# Altium schematic symbol library jlcpcb_2025_04_inductors_extended_0603.schlib: 1269 symbols (part 1 of 7) (continued)
## CH1608H4N7S_f_
designator L?  Inductance: 4.7nH
Inductor, 4.7nH, 200mΩ, 500mA, SMD 0603; Manufacturer: CEC(Shenzhen Zhenhua Fu Elec); Manufacturer Part Number: CH1608H4N7S(f); Self-Resonant Frequency: 3GHz; Q Factor: 8@100MHz; Package Size: 0603; JLCPCB Basic Part: No; JLCPCB Part Number: C316309; Supplier 1: LCSC; Category: Inductors; Supplier Part Number 1: C316309; Rated Current: 500mA; DC Resistance: 200mΩ; RoHS: Yes; ComponentLink1Description: Datasheet; ComponentLink1URL: https://wmsc.lcsc.com/wmsc/upload/file/pdf/v2/lcsc/2304140030_CEC-Shenzhen-Zhenhua-Fu-Elec-CH1608H4N7S-f_C316309.pdf; ComponentLink2Description: JLCPCB Part URL; ComponentLink2URL: https://jlcpcb.com/partdetail/C316309; ComponentLink3Description: LCSC Part URL; ComponentLink3URL: https://lcsc.com/product-detail/Inductors-SMD_CECShenzhen-Zhenhua-Fu-Elec-CECShenzhen-Zhenhua-Fu-Elec-CH1608H4N7Sf_C316309.html
footprint IND-0603 (0603 (1608M) Inductor)
pins: 1, 2

## CH1608H5N6S_f_
designator L?  Inductance: 5.6nH
Inductor, 5.6nH, 300mΩ, 500mA, SMD 0603; Manufacturer: CEC(Shenzhen Zhenhua Fu Elec); Manufacturer Part Number: CH1608H5N6S(f); Self-Resonant Frequency: 3GHz; Q Factor: 8@100MHz; Package Size: 0603; JLCPCB Basic Part: No; JLCPCB Part Number: C316307; Supplier 1: LCSC; Category: Inductors; Supplier Part Number 1: C316307; Rated Current: 500mA; DC Resistance: 300mΩ; RoHS: Yes; ComponentLink1Description: Datasheet; ComponentLink1URL: https://wmsc.lcsc.com/wmsc/upload/file/pdf/v2/lcsc/2304140030_CEC-Shenzhen-Zhenhua-Fu-Elec-CH1608H5N6S-f_C316307.pdf; ComponentLink2Description: JLCPCB Part URL; ComponentLink2URL: https://jlcpcb.com/partdetail/C316307; ComponentLink3Description: LCSC Part URL; ComponentLink3URL: https://lcsc.com/product-detail/Inductors-SMD_CECShenzhen-Zhenhua-Fu-Elec-CECShenzhen-Zhenhua-Fu-Elec-CH1608H5N6Sf_C316307.html
footprint IND-0603 (0603 (1608M) Inductor)
pins: 1, 2

## CH1608H6N8J_f_
designator L?  Inductance: 6.8nH
Inductor, 6.8nH, ±5%, 300mΩ, 500mA, SMD 0603; Manufacturer: CEC(Shenzhen Zhenhua Fu Elec); Manufacturer Part Number: CH1608H6N8J(f); Self-Resonant Frequency: 3GHz; Q Factor: 8@100MHz; Package Size: 0603; JLCPCB Basic Part: No; JLCPCB Part Number: C316305; Supplier 1: LCSC; Category: Inductors; Supplier Part Number 1: C316305; Tolerance: ±5%; Rated Current: 500mA; DC Resistance: 300mΩ; RoHS: Yes; ComponentLink1Description: Datasheet; ComponentLink1URL: https://wmsc.lcsc.com/wmsc/upload/file/pdf/v2/lcsc/2304140030_CEC-Shenzhen-Zhenhua-Fu-Elec-CH1608H6N8J-f_C316305.pdf; ComponentLink2Description: JLCPCB Part URL; ComponentLink2URL: https://jlcpcb.com/partdetail/C316305; ComponentLink3Description: LCSC Part URL; ComponentLink3URL: https://lcsc.com/product-detail/Inductors-SMD_CECShenzhen-Zhenhua-Fu-Elec-CECShenzhen-Zhenhua-Fu-Elec-CH1608H6N8Jf_C316305.html
footprint IND-0603 (0603 (1608M) Inductor)
pins: 1, 2

## CH1608H12NJ_f_
designator L?  Inductance: 12nH
Inductor, 12nH, ±5%, 500mΩ, 300mA, SMD 0603; Manufacturer: CEC(Shenzhen Zhenhua Fu Elec); Manufacturer Part Number: CH1608H12NJ(f); Self-Resonant Frequency: 3GHz; Q Factor: 8@100MHz; Package Size: 0603; JLCPCB Basic Part: No; JLCPCB Part Number: C316323; Supplier 1: LCSC; Category: Inductors; Supplier Part Number 1: C316323; Tolerance: ±5%; Rated Current: 300mA; DC Resistance: 500mΩ; RoHS: Yes; ComponentLink1Description: Datasheet; ComponentLink1URL: https://wmsc.lcsc.com/wmsc/upload/file/pdf/v2/lcsc/2304140030_CEC-Shenzhen-Zhenhua-Fu-Elec-CH1608H12NJ-f_C316323.pdf; ComponentLink2Description: JLCPCB Part URL; ComponentLink2URL: https://jlcpcb.com/partdetail/C316323; ComponentLink3Description: LCSC Part URL; ComponentLink3URL: https://lcsc.com/product-detail/Inductors-SMD_CECShenzhen-Zhenhua-Fu-Elec-CECShenzhen-Zhenhua-Fu-Elec-CH1608H12NJf_C316323.html
footprint IND-0603 (0603 (1608M) Inductor)
pins: 1, 2

## CH1608H18NJ_f_
designator L?  Inductance: 18nH
Inductor, 18nH, ±5%, 600mΩ, 300mA, SMD 0603; Manufacturer: CEC(Shenzhen Zhenhua Fu Elec); Manufacturer Part Number: CH1608H18NJ(f); Self-Resonant Frequency: 3GHz; Q Factor: 8@100MHz; Package Size: 0603; JLCPCB Basic Part: No; JLCPCB Part Number: C316321; Supplier 1: LCSC; Category: Inductors; Supplier Part Number 1: C316321; Tolerance: ±5%; Rated Current: 300mA; DC Resistance: 600mΩ; RoHS: Yes; ComponentLink1Description: Datasheet; ComponentLink1URL: https://wmsc.lcsc.com/wmsc/upload/file/pdf/v2/lcsc/2304140030_CEC-Shenzhen-Zhenhua-Fu-Elec-CH1608H18NJ-f_C316321.pdf; ComponentLink2Description: JLCPCB Part URL; ComponentLink2URL: https://jlcpcb.com/partdetail/C316321; ComponentLink3Description: LCSC Part URL; ComponentLink3URL: https://lcsc.com/product-detail/Inductors-SMD_CECShenzhen-Zhenhua-Fu-Elec-CECShenzhen-Zhenhua-Fu-Elec-CH1608H18NJf_C316321.html
footprint IND-0603 (0603 (1608M) Inductor)
pins: 1, 2

## CH1608H27NJ_f_
designator L?  Inductance: 27nH
Inductor, 27nH, ±5%, 800mΩ, 300mA, SMD 0603; Manufacturer: CEC(Shenzhen Zhenhua Fu Elec); Manufacturer Part Number: CH1608H27NJ(f); Self-Resonant Frequency: 3GHz; Q Factor: 8@100MHz; Package Size: 0603; JLCPCB Basic Part: No; JLCPCB Part Number: C316316; Supplier 1: LCSC; Category: Inductors; Supplier Part Number 1: C316316; Tolerance: ±5%; Rated Current: 300mA; DC Resistance: 800mΩ; RoHS: Yes; ComponentLink1Description: Datasheet; ComponentLink1URL: https://wmsc.lcsc.com/wmsc/upload/file/pdf/v2/lcsc/2304140030_CEC-Shenzhen-Zhenhua-Fu-Elec-CH1608H27NJ-f_C316316.pdf; ComponentLink2Description: JLCPCB Part URL; ComponentLink2URL: https://jlcpcb.com/partdetail/C316316; ComponentLink3Description: LCSC Part URL; ComponentLink3URL: https://lcsc.com/product-detail/Inductors-SMD_CECShenzhen-Zhenhua-Fu-Elec-CECShenzhen-Zhenhua-Fu-Elec-CH1608H27NJf_C316316.html
footprint IND-0603 (0603 (1608M) Inductor)
pins: 1, 2

## CI1608AR12K
designator L?  Inductance: 120nH
Inductor, 120nH, ±10%, 500mΩ, 50mA, SMD 0603; Manufacturer: CEC(Shenzhen Zhenhua Fu Elec); Manufacturer Part Number: CI1608AR12K; Self-Resonant Frequency: 205MHz; Q Factor: 15@25MHz; Package Size: 0603; JLCPCB Basic Part: No; JLCPCB Part Number: C107493; Supplier 1: LCSC; Category: Inductors; Supplier Part Number 1: C107493; Tolerance: ±10%; Rated Current: 50mA; DC Resistance: 500mΩ; RoHS: Yes; ComponentLink1Description: Datasheet; ComponentLink1URL: https://wmsc.lcsc.com/wmsc/upload/file/pdf/v2/lcsc/2304140030_CEC-Shenzhen-Zhenhua-Fu-Elec-CI1608AR12K_C107493.pdf; ComponentLink2Description: JLCPCB Part URL; ComponentLink2URL: https://jlcpcb.com/partdetail/C107493; ComponentLink3Description: LCSC Part URL; ComponentLink3URL: https://lcsc.com/product-detail/Inductors-SMD_CECShenzhen-Zhenhua-Fu-Elec-CECShenzhen-Zhenhua-Fu-Elec-CI1608AR12K_C107493.html
footprint IND-0603 (0603 (1608M) Inductor)
pins: 1, 2

## CI1608AR15K
designator L?  Inductance: 150nH
Inductor, 150nH, ±10%, 600mΩ, 50mA, SMD 0603; Manufacturer: CEC(Shenzhen Zhenhua Fu Elec); Manufacturer Part Number: CI1608AR15K; Self-Resonant Frequency: 180MHz; Q Factor: 15@25MHz; Package Size: 0603; JLCPCB Basic Part: No; JLCPCB Part Number: C107494; Supplier 1: LCSC; Category: Inductors; Supplier Part Number 1: C107494; Tolerance: ±10%; Rated Current: 50mA; DC Resistance: 600mΩ; RoHS: Yes; ComponentLink1Description: Datasheet; ComponentLink1URL: https://wmsc.lcsc.com/wmsc/upload/file/pdf/v2/lcsc/2304140030_CEC-Shenzhen-Zhenhua-Fu-Elec-CI1608AR15K_C107494.pdf; ComponentLink2Description: JLCPCB Part URL; ComponentLink2URL: https://jlcpcb.com/partdetail/C107494; ComponentLink3Description: LCSC Part URL; ComponentLink3URL: https://lcsc.com/product-detail/Inductors-SMD_CECShenzhen-Zhenhua-Fu-Elec-CECShenzhen-Zhenhua-Fu-Elec-CI1608AR15K_C107494.html
footprint IND-0603 (0603 (1608M) Inductor)
pins: 1, 2

## CI1608B1R8K
designator L?  Inductance: 1.8uH
Inductor, 1.8uH, ±10%, 950mΩ, 25mA, SMD 0603; Manufacturer: CEC(Shenzhen Zhenhua Fu Elec); Manufacturer Part Number: CI1608B1R8K; Self-Resonant Frequency: 50MHz; Q Factor: 35@10MHz; Package Size: 0603; JLCPCB Basic Part: No; JLCPCB Part Number: C107507; Supplier 1: LCSC; Category: Inductors; Supplier Part Number 1: C107507; Tolerance: ±10%; Rated Current: 25mA; DC Resistance: 950mΩ; RoHS: Yes; ComponentLink1Description: Datasheet; ComponentLink1URL: https://wmsc.lcsc.com/wmsc/upload/file/pdf/v2/lcsc/2304140030_CEC-Shenzhen-Zhenhua-Fu-Elec-CI1608B1R8K_C107507.pdf; ComponentLink2Description: JLCPCB Part URL; ComponentLink2URL: https://jlcpcb.com/partdetail/C107507; ComponentLink3Description: LCSC Part URL; ComponentLink3URL: https://lcsc.com/product-detail/Inductors-SMD_CECShenzhen-Zhenhua-Fu-Elec-CECShenzhen-Zhenhua-Fu-Elec-CI1608B1R8K_C107507.html
footprint IND-0603 (0603 (1608M) Inductor)
pins: 1, 2

## CI1608B2R7K
designator L?  Inductance: 2.7uH
Inductor, 2.7uH, ±10%, 1.35Ω, 15mA, SMD 0603; Manufacturer: CEC(Shenzhen Zhenhua Fu Elec); Manufacturer Part Number: CI1608B2R7K; Self-Resonant Frequency: 40MHz; Q Factor: 35@10MHz; Package Size: 0603; JLCPCB Basic Part: No; JLCPCB Part Number: C107509; Supplier 1: LCSC; Category: Inductors; Supplier Part Number 1: C107509; Tolerance: ±10%; Rated Current: 15mA; DC Resistance: 1.35Ω; RoHS: Yes; ComponentLink1Description: Datasheet; ComponentLink1URL: https://wmsc.lcsc.com/wmsc/upload/file/pdf/v2/lcsc/2304140030_CEC-Shenzhen-Zhenhua-Fu-Elec-CI1608B2R7K_C107509.pdf; ComponentLink2Description: JLCPCB Part URL; ComponentLink2URL: https://jlcpcb.com/partdetail/C107509; ComponentLink3Description: LCSC Part URL; ComponentLink3URL: https://lcsc.com/product-detail/Inductors-SMD_CECShenzhen-Zhenhua-Fu-Elec-CECShenzhen-Zhenhua-Fu-Elec-CI1608B2R7K_C107509.html
footprint IND-0603 (0603 (1608M) Inductor)
pins: 1, 2

## CI1608B3R9K
designator L?  Inductance: 3.9uH
Inductor, 3.9uH, ±10%, 1.7Ω, 15mA, SMD 0603; Manufacturer: CEC(Shenzhen Zhenhua Fu Elec); Manufacturer Part Number: CI1608B3R9K; Self-Resonant Frequency: 36MHz; Q Factor: 35@10MHz; Package Size: 0603; JLCPCB Basic Part: No; JLCPCB Part Number: C107511; Supplier 1: LCSC; Category: Inductors; Supplier Part Number 1: C107511; Tolerance: ±10%; Rated Current: 15mA; DC Resistance: 1.7Ω; RoHS: Yes; ComponentLink1Description: Datasheet; ComponentLink1URL: https://wmsc.lcsc.com/wmsc/upload/file/pdf/v2/lcsc/2304140030_CEC-Shenzhen-Zhenhua-Fu-Elec-CI1608B3R9K_C107511.pdf; ComponentLink2Description: JLCPCB Part URL; ComponentLink2URL: https://jlcpcb.com/partdetail/C107511; ComponentLink3Description: LCSC Part URL; ComponentLink3URL: https://lcsc.com/product-detail/Inductors-SMD_CECShenzhen-Zhenhua-Fu-Elec-CECShenzhen-Zhenhua-Fu-Elec-CI1608B3R9K_C107511.html
footprint IND-0603 (0603 (1608M) Inductor)
pins: 1, 2

## CI1608C5R6K
designator L?  Inductance: 5.6uH
Inductor, 5.6uH, ±10%, 1.55Ω, 5mA, SMD 0603; Manufacturer: CEC(Shenzhen Zhenhua Fu Elec); Manufacturer Part Number: CI1608C5R6K; Self-Resonant Frequency: 22MHz; Q Factor: 35@4MHz; Package Size: 0603; JLCPCB Basic Part: No; JLCPCB Part Number: C107513; Supplier 1: LCSC; Category: Inductors; Supplier Part Number 1: C107513; Tolerance: ±10%; Rated Current: 5mA; DC Resistance: 1.55Ω; RoHS: Yes; ComponentLink1Description: Datasheet; ComponentLink1URL: https://wmsc.lcsc.com/wmsc/upload/file/pdf/v2/lcsc/2304140030_CEC-Shenzhen-Zhenhua-Fu-Elec-CI1608C5R6K_C107513.pdf; ComponentLink2Description: JLCPCB Part URL; ComponentLink2URL: https://jlcpcb.com/partdetail/C107513; ComponentLink3Description: LCSC Part URL; ComponentLink3URL: https://lcsc.com/product-detail/Inductors-SMD_CECShenzhen-Zhenhua-Fu-Elec-CECShenzhen-Zhenhua-Fu-Elec-CI1608C5R6K_C107513.html
footprint IND-0603 (0603 (1608M) Inductor)
pins: 1, 2

## CL160808T-1R8K-N
designator L?  Inductance: 1.8uH
Inductor, 1.8uH, ±10%, 950mΩ, 25mA, SMD 0603; Manufacturer: Chilisin Elec; Manufacturer Part Number: CL160808T-1R8K-N; Self-Resonant Frequency: 50MHz; Q Factor: 35@10MHz; Package Size: 0603; JLCPCB Basic Part: No; JLCPCB Part Number: C142273; Supplier 1: LCSC; Category: Inductors; Supplier Part Number 1: C142273; Tolerance: ±10%; Rated Current: 25mA; DC Resistance: 950mΩ; RoHS: Yes; ComponentLink1Description: Datasheet; ComponentLink1URL: https://wmsc.lcsc.com/wmsc/upload/file/pdf/v2/lcsc/2304140030_Chilisin-Elec-CL160808T-1R8K-N_C142273.pdf; ComponentLink2Description: JLCPCB Part URL; ComponentLink2URL: https://jlcpcb.com/partdetail/C142273; ComponentLink3Description: LCSC Part URL; ComponentLink3URL: https://lcsc.com/product-detail/Inductors-SMD_Chilisin-Elec-Chilisin-Elec-CL160808T-1R8K-N_C142273.html
footprint IND-0603 (0603 (1608M) Inductor)
pins: 1, 2

## CL160808T-8R2K-N
designator L?  Inductance: 8.2nH
Inductor, 8.2nH, ±10%, 1.5Ω, 5mA, SMD 0603; Manufacturer: Chilisin Elec; Manufacturer Part Number: CL160808T-8R2K-N; Self-Resonant Frequency: 18MHz; Q Factor: 30@4MHz; Package Size: 0603; JLCPCB Basic Part: No; JLCPCB Part Number: C2913992; Supplier 1: LCSC; Category: Inductors; Supplier Part Number 1: C2913992; Tolerance: ±10%; Rated Current: 5mA; DC Resistance: 1.5Ω; RoHS: Yes; ComponentLink1Description: Datasheet; ComponentLink1URL: https://wmsc.lcsc.com/wmsc/upload/file/pdf/v2/lcsc/2111051730_Chilisin-Elec-CL160808T-8R2K-N_C2913992.pdf; ComponentLink2Description: JLCPCB Part URL; ComponentLink2URL: https://jlcpcb.com/partdetail/C2913992; ComponentLink3Description: LCSC Part URL; ComponentLink3URL: https://lcsc.com/product-detail/Inductors-SMD_Chilisin-Elec-Chilisin-Elec-CL160808T-8R2K-N_C2913992.html
footprint IND-0603 (0603 (1608M) Inductor)
pins: 1, 2

## CL160808T-100K-N
designator L?  Inductance: 10uH
Inductor, 10uH, ±10%, 1.7Ω, 5mA, SMD 0603; Manufacturer: Chilisin Elec; Manufacturer Part Number: CL160808T-100K-N; Self-Resonant Frequency: 17MHz; Q Factor: 30@2MHz; Package Size: 0603; JLCPCB Basic Part: No; JLCPCB Part Number: C180941; Supplier 1: LCSC; Category: Inductors; Supplier Part Number 1: C180941; Tolerance: ±10%; Rated Current: 5mA; DC Resistance: 1.7Ω; RoHS: Yes; ComponentLink1Description: Datasheet; ComponentLink1URL: https://wmsc.lcsc.com/wmsc/upload/file/pdf/v2/lcsc/2304140030_Chilisin-Elec-CL160808T-100K-N_C180941.pdf; ComponentLink2Description: JLCPCB Part URL; ComponentLink2URL: https://jlcpcb.com/partdetail/C180941; ComponentLink3Description: LCSC Part URL; ComponentLink3URL: https://lcsc.com/product-detail/Inductors-SMD_Chilisin-Elec-Chilisin-Elec-CL160808T-100K-N_C180941.html
footprint IND-0603 (0603 (1608M) Inductor)
pins: 1, 2

## CL160808T-220K-N
designator L?  Inductance: 22uH
Inductor, 22uH, ±10%, 1.7Ω, 1mA, SMD 0603; Manufacturer: Chilisin Elec; Manufacturer Part Number: CL160808T-220K-N; Self-Resonant Frequency: 11MHz; Q Factor: 20@1MHz; Package Size: 0603; JLCPCB Basic Part: No; JLCPCB Part Number: C365932; Supplier 1: LCSC; Category: Inductors; Supplier Part Number 1: C365932; Tolerance: ±10%; Rated Current: 1mA; DC Resistance: 1.7Ω; RoHS: Yes; ComponentLink1Description: Datasheet; ComponentLink1URL: https://wmsc.lcsc.com/wmsc/upload/file/pdf/v2/lcsc/2304140030_Chilisin-Elec-CL160808T-220K-N_C365932.pdf; ComponentLink2Description: JLCPCB Part URL; ComponentLink2URL: https://jlcpcb.com/partdetail/C365932; ComponentLink3Description: LCSC Part URL; ComponentLink3URL: https://lcsc.com/product-detail/Inductors-SMD_Chilisin-Elec-Chilisin-Elec-CL160808T-220K-N_C365932.html
footprint IND-0603 (0603 (1608M) Inductor)
pins: 1, 2

## CL160808T-R10K-N
designator L?  Inductance: 100nH
Inductor, 100nH, ±10%, 500mΩ, 50mA, SMD 0603; Manufacturer: Chilisin Elec; Manufacturer Part Number: CL160808T-R10K-N; Self-Resonant Frequency: 240MHz; Q Factor: 25@25MHz; Package Size: 0603; JLCPCB Basic Part: No; JLCPCB Part Number: C365925; Supplier 1: LCSC; Category: Inductors; Supplier Part Number 1: C365925; Tolerance: ±10%; Rated Current: 50mA; DC Resistance: 500mΩ; RoHS: Yes; ComponentLink1Description: Datasheet; ComponentLink1URL: https://wmsc.lcsc.com/wmsc/upload/file/pdf/v2/lcsc/1912111437_Chilisin-Elec-CL160808T-R10K-N_C365925.pdf; ComponentLink2Description: JLCPCB Part URL; ComponentLink2URL: https://jlcpcb.com/partdetail/C365925; ComponentLink3Description: LCSC Part URL; ComponentLink3URL: https://lcsc.com/product-detail/Inductors-SMD_Chilisin-Elec-Chilisin-Elec-CL160808T-R10K-N_C365925.html
footprint IND-0603 (0603 (1608M) Inductor)
pins: 1, 2

## CL160808T-R27K-N
designator L?  Inductance: 270nH
Inductor, 270nH, ±10%, 800mΩ, 50mA, SMD 0603; Manufacturer: Chilisin Elec; Manufacturer Part Number: CL160808T-R27K-N; Self-Resonant Frequency: 136MHz; Q Factor: 25@25MHz; Package Size: 0603; JLCPCB Basic Part: No; JLCPCB Part Number: C142271; Supplier 1: LCSC; Category: Inductors; Supplier Part Number 1: C142271; Tolerance: ±10%; Rated Current: 50mA; DC Resistance: 800mΩ; RoHS: Yes; ComponentLink1Description: Datasheet; ComponentLink1URL: https://wmsc.lcsc.com/wmsc/upload/file/pdf/v2/lcsc/2304140030_Chilisin-Elec-CL160808T-R27K-N_C142271.pdf; ComponentLink2Description: JLCPCB Part URL; ComponentLink2URL: https://jlcpcb.com/partdetail/C142271; ComponentLink3Description: LCSC Part URL; ComponentLink3URL: https://lcsc.com/product-detail/Inductors-SMD_Chilisin-Elec-Chilisin-Elec-CL160808T-R27K-N_C142271.html
footprint IND-0603 (0603 (1608M) Inductor)
pins: 1, 2

## CLH1608T-1N0S-S
designator L?  Inductance: 1nH
Inductor, 1nH, 100mΩ, 600mA, SMD 0603; Manufacturer: Chilisin Elec; Manufacturer Part Number: CLH1608T-1N0S-S; Self-Resonant Frequency: 10GHz; Q Factor: 8@100MHz; Package Size: 0603; JLCPCB Basic Part: No; JLCPCB Part Number: C365904; Supplier 1: LCSC; Category: Inductors; Supplier Part Number 1: C365904; Rated Current: 600mA; DC Resistance: 100mΩ; RoHS: Yes; ComponentLink1Description: Datasheet; ComponentLink1URL: https://wmsc.lcsc.com/wmsc/upload/file/pdf/v2/lcsc/2304140030_Chilisin-Elec-CLH1608T-1N0S-S_C365904.pdf; ComponentLink2Description: JLCPCB Part URL; ComponentLink2URL: https://jlcpcb.com/partdetail/C365904; ComponentLink3Description: LCSC Part URL; ComponentLink3URL: https://lcsc.com/product-detail/Inductors-SMD_Chilisin-Elec-Chilisin-Elec-CLH1608T-1N0S-S_C365904.html
footprint IND-0603 (0603 (1608M) Inductor)
pins: 1, 2

## CLH1608T-1N2S-S
designator L?  Inductance: 1.2nH
Inductor, 1.2nH, 100mΩ, 600mA, SMD 0603; Manufacturer: Chilisin Elec; Manufacturer Part Number: CLH1608T-1N2S-S; Self-Resonant Frequency: 10GHz; Q Factor: 8@100MHz; Package Size: 0603; JLCPCB Basic Part: No; JLCPCB Part Number: C180936; Supplier 1: LCSC; Category: Inductors; Supplier Part Number 1: C180936; Rated Current: 600mA; DC Resistance: 100mΩ; RoHS: Yes; ComponentLink1Description: Datasheet; ComponentLink1URL: https://wmsc.lcsc.com/wmsc/upload/file/pdf/v2/lcsc/2304140030_Chilisin-Elec-CLH1608T-1N2S-S_C180936.pdf; ComponentLink2Description: JLCPCB Part URL; ComponentLink2URL: https://jlcpcb.com/partdetail/C180936; ComponentLink3Description: LCSC Part URL; ComponentLink3URL: https://lcsc.com/product-detail/Inductors-SMD_Chilisin-Elec-Chilisin-Elec-CLH1608T-1N2S-S_C180936.html
footprint IND-0603 (0603 (1608M) Inductor)
pins: 1, 2

## CLH1608T-1N5S-S
designator L?  Inductance: 1.5nH
Inductor, 1.5nH, 100mΩ, 600mA, SMD 0603; Manufacturer: Chilisin Elec; Manufacturer Part Number: CLH1608T-1N5S-S; Self-Resonant Frequency: 8GHz; Q Factor: 8@100MHz; Package Size: 0603; JLCPCB Basic Part: No; JLCPCB Part Number: C365905; Supplier 1: LCSC; Category: Inductors; Supplier Part Number 1: C365905; Rated Current: 600mA; DC Resistance: 100mΩ; RoHS: Yes; ComponentLink1Description: Datasheet; ComponentLink1URL: https://wmsc.lcsc.com/wmsc/upload/file/pdf/v2/lcsc/2304140030_Chilisin-Elec-CLH1608T-1N5S-S_C365905.pdf; ComponentLink2Description: JLCPCB Part URL; ComponentLink2URL: https://jlcpcb.com/partdetail/C365905; ComponentLink3Description: LCSC Part URL; ComponentLink3URL: https://lcsc.com/product-detail/Inductors-SMD_Chilisin-Elec-Chilisin-Elec-CLH1608T-1N5S-S_C365905.html
footprint IND-0603 (0603 (1608M) Inductor)
pins: 1, 2

## CLH1608T-2N2S-S
designator L?  Inductance: 2.2nH
Inductor, 2.2nH, 100mΩ, 600mA, SMD 0603; Manufacturer: Chilisin Elec; Manufacturer Part Number: CLH1608T-2N2S-S; Self-Resonant Frequency: 7.2GHz; Q Factor: 8@100MHz; Package Size: 0603; JLCPCB Basic Part: No; JLCPCB Part Number: C142203; Supplier 1: LCSC; Category: Inductors; Supplier Part Number 1: C142203; Rated Current: 600mA; DC Resistance: 100mΩ; RoHS: Yes; ComponentLink1Description: Datasheet; ComponentLink1URL: https://wmsc.lcsc.com/wmsc/upload/file/pdf/v2/lcsc/2304140030_Chilisin-Elec-CLH1608T-2N2S-S_C142203.pdf; ComponentLink2Description: JLCPCB Part URL; ComponentLink2URL: https://jlcpcb.com/partdetail/C142203; ComponentLink3Description: LCSC Part URL; ComponentLink3URL: https://lcsc.com/product-detail/Inductors-SMD_Chilisin-Elec-Chilisin-Elec-CLH1608T-2N2S-S_C142203.html
footprint IND-0603 (0603 (1608M) Inductor)
pins: 1, 2

## CLH1608T-2N7S-S
designator L?  Inductance: 2.7nH
Inductor, 2.7nH, 100mΩ, 600mA, SMD 0603; Manufacturer: Chilisin Elec; Manufacturer Part Number: CLH1608T-2N7S-S; Self-Resonant Frequency: 6.2GHz; Q Factor: 10@100MHz; Package Size: 0603; JLCPCB Basic Part: No; JLCPCB Part Number: C142202; Supplier 1: LCSC; Category: Inductors; Supplier Part Number 1: C142202; Rated Current: 600mA; DC Resistance: 100mΩ; RoHS: Yes; ComponentLink1Description: Datasheet; ComponentLink1URL: https://wmsc.lcsc.com/wmsc/upload/file/pdf/v2/lcsc/2304140030_Chilisin-Elec-CLH1608T-2N7S-S_C142202.pdf; ComponentLink2Description: JLCPCB Part URL; ComponentLink2URL: https://jlcpcb.com/partdetail/C142202; ComponentLink3Description: LCSC Part URL; ComponentLink3URL: https://lcsc.com/product-detail/Inductors-SMD_Chilisin-Elec-Chilisin-Elec-CLH1608T-2N7S-S_C142202.html
footprint IND-0603 (0603 (1608M) Inductor)
pins: 1, 2

## CLH1608T-3N0S-S
designator L?  Inductance: 3nH
Inductor, 3nH, 120mΩ, 600mA, SMD 0603; Manufacturer: Chilisin Elec; Manufacturer Part Number: CLH1608T-3N0S-S; Self-Resonant Frequency: 5.2GHz; Q Factor: 10@100MHz; Package Size: 0603; JLCPCB Basic Part: No; JLCPCB Part Number: C365893; Supplier 1: LCSC; Category: Inductors; Supplier Part Number 1: C365893; Rated Current: 600mA; DC Resistance: 120mΩ; RoHS: Yes; ComponentLink1Description: Datasheet; ComponentLink1URL: https://wmsc.lcsc.com/wmsc/upload/file/pdf/v2/lcsc/2304140030_Chilisin-Elec-CLH1608T-3N0S-S_C365893.pdf; ComponentLink2Description: JLCPCB Part URL; ComponentLink2URL: https://jlcpcb.com/partdetail/C365893; ComponentLink3Description: LCSC Part URL; ComponentLink3URL: https://lcsc.com/product-detail/Inductors-SMD_Chilisin-Elec-Chilisin-Elec-CLH1608T-3N0S-S_C365893.html
footprint IND-0603 (0603 (1608M) Inductor)
pins: 1, 2

## CLH1608T-3N9S-S
designator L?  Inductance: 3.9nH
Inductor, 3.9nH, 140mΩ, 600mA, SMD 0603; Manufacturer: Chilisin Elec; Manufacturer Part Number: CLH1608T-3N9S-S; Self-Resonant Frequency: 5GHz; Q Factor: 10@100MHz; Package Size: 0603; JLCPCB Basic Part: No; JLCPCB Part Number: C142199; Supplier 1: LCSC; Category: Inductors; Supplier Part Number 1: C142199; Rated Current: 600mA; DC Resistance: 140mΩ; RoHS: Yes; ComponentLink1Description: Datasheet; ComponentLink1URL: https://wmsc.lcsc.com/wmsc/upload/file/pdf/v2/lcsc/2304140030_Chilisin-Elec-CLH1608T-3N9S-S_C142199.pdf; ComponentLink2Description: JLCPCB Part URL; ComponentLink2URL: https://jlcpcb.com/partdetail/C142199; ComponentLink3Description: LCSC Part URL; ComponentLink3URL: https://lcsc.com/product-detail/Inductors-SMD_Chilisin-Elec-Chilisin-Elec-CLH1608T-3N9S-S_C142199.html
footprint IND-0603 (0603 (1608M) Inductor)
pins: 1, 2

## CLH1608T-4N7J-S
designator L?  Inductance: 4.7nH
Inductor, 4.7nH, ±5%, 160mΩ, 600mA, SMD 0603; Manufacturer: Chilisin Elec; Manufacturer Part Number: CLH1608T-4N7J-S; Self-Resonant Frequency: 4.75GHz; Q Factor: 10@100MHz; Package Size: 0603; JLCPCB Basic Part: No; JLCPCB Part Number: C373738; Supplier 1: LCSC; Category: Inductors; Supplier Part Number 1: C373738; Tolerance: ±5%; Rated Current: 600mA; DC Resistance: 160mΩ; RoHS: Yes; ComponentLink1Description: Datasheet; ComponentLink1URL: https://wmsc.lcsc.com/wmsc/upload/file/pdf/v2/lcsc/2304140030_Chilisin-Elec-CLH1608T-4N7J-S_C373738.pdf; ComponentLink2Description: JLCPCB Part URL; ComponentLink2URL: https://jlcpcb.com/partdetail/C373738; ComponentLink3Description: LCSC Part URL; ComponentLink3URL: https://lcsc.com/product-detail/Inductors-SMD_Chilisin-Elec-Chilisin-Elec-CLH1608T-4N7J-S_C373738.html
footprint IND-0603 (0603 (1608M) Inductor)
pins: 1, 2

## CLH1608T-4N7S-S
designator L?  Inductance: 4.7nH
Inductor, 4.7nH, 160mΩ, 600mA, SMD 0603; Manufacturer: Chilisin Elec; Manufacturer Part Number: CLH1608T-4N7S-S; Self-Resonant Frequency: 4.75GHz; Q Factor: 10@100MHz; Package Size: 0603; JLCPCB Basic Part: No; JLCPCB Part Number: C180935; Supplier 1: LCSC; Category: Inductors; Supplier Part Number 1: C180935; Rated Current: 600mA; DC Resistance: 160mΩ; RoHS: Yes; ComponentLink1Description: Datasheet; ComponentLink1URL: https://wmsc.lcsc.com/wmsc/upload/file/pdf/v2/lcsc/2304140030_Chilisin-Elec-CLH1608T-4N7S-S_C180935.pdf; ComponentLink2Description: JLCPCB Part URL; ComponentLink2URL: https://jlcpcb.com/partdetail/C180935; ComponentLink3Description: LCSC Part URL; ComponentLink3URL: https://lcsc.com/product-detail/Inductors-SMD_Chilisin-Elec-Chilisin-Elec-CLH1608T-4N7S-S_C180935.html
footprint IND-0603 (0603 (1608M) Inductor)
pins: 1, 2

## CLH1608T-5N6S-S
designator L?  Inductance: 5.6nH
Inductor, 5.6nH, 180mΩ, 600mA, SMD 0603; Manufacturer: Chilisin Elec; Manufacturer Part Number: CLH1608T-5N6S-S; Self-Resonant Frequency: 4.1GHz; Q Factor: 10@100MHz; Package Size: 0603; JLCPCB Basic Part: No; JLCPCB Part Number: C180934; Supplier 1: LCSC; Category: Inductors; Supplier Part Number 1: C180934; Rated Current: 600mA; DC Resistance: 180mΩ; RoHS: Yes; ComponentLink1Description: Datasheet; ComponentLink1URL: https://wmsc.lcsc.com/wmsc/upload/file/pdf/v2/lcsc/2304140030_Chilisin-Elec-CLH1608T-5N6S-S_C180934.pdf; ComponentLink2Description: JLCPCB Part URL; ComponentLink2URL: https://jlcpcb.com/partdetail/C180934; ComponentLink3Description: LCSC Part URL; ComponentLink3URL: https://lcsc.com/product-detail/Inductors-SMD_Chilisin-Elec-Chilisin-Elec-CLH1608T-5N6S-S_C180934.html
footprint IND-0603 (0603 (1608M) Inductor)
pins: 1, 2

## CLH1608T-6N8J-S
designator L?  Inductance: 6.8nH
Inductor, 6.8nH, ±5%, 220mΩ, 600mA, SMD 0603; Manufacturer: Chilisin Elec; Manufacturer Part Number: CLH1608T-6N8J-S; Self-Resonant Frequency: 3.75GHz; Q Factor: 10@100MHz; Package Size: 0603; JLCPCB Basic Part: No; JLCPCB Part Number: C142196; Supplier 1: LCSC; Category: Inductors; Supplier Part Number 1: C142196; Tolerance: ±5%; Rated Current: 600mA; DC Resistance: 220mΩ; RoHS: Yes; ComponentLink1Description: Datasheet; ComponentLink1URL: https://wmsc.lcsc.com/wmsc/upload/file/pdf/v2/lcsc/2304140030_Chilisin-Elec-CLH1608T-6N8J-S_C142196.pdf; ComponentLink2Description: JLCPCB Part URL; ComponentLink2URL: https://jlcpcb.com/partdetail/C142196; ComponentLink3Description: LCSC Part URL; ComponentLink3URL: https://lcsc.com/product-detail/Inductors-SMD_Chilisin-Elec-Chilisin-Elec-CLH1608T-6N8J-S_C142196.html
footprint IND-0603 (0603 (1608M) Inductor)
pins: 1, 2

## CLH1608T-8N2J-S
designator L?  Inductance: 8.2nH
Inductor, 8.2nH, ±5%, 240mΩ, 600mA, SMD 0603; Manufacturer: Chilisin Elec; Manufacturer Part Number: CLH1608T-8N2J-S; Self-Resonant Frequency: 3.3GHz; Q Factor: 10@100MHz; Package Size: 0603; JLCPCB Basic Part: No; JLCPCB Part Number: C329645; Supplier 1: LCSC; Category: Inductors; Supplier Part Number 1: C329645; Tolerance: ±5%; Rated Current: 600mA; DC Resistance: 240mΩ; RoHS: Yes; ComponentLink1Description: Datasheet; ComponentLink1URL: https://wmsc.lcsc.com/wmsc/upload/file/pdf/v2/lcsc/2304140030_Chilisin-Elec-CLH1608T-8N2J-S_C329645.pdf; ComponentLink2Description: JLCPCB Part URL; ComponentLink2URL: https://jlcpcb.com/partdetail/C329645; ComponentLink3Description: LCSC Part URL; ComponentLink3URL: https://lcsc.com/product-detail/Inductors-SMD_Chilisin-Elec-Chilisin-Elec-CLH1608T-8N2J-S_C329645.html
footprint IND-0603 (0603 (1608M) Inductor)
pins: 1, 2

## CLH1608T-10NJ-S
designator L?  Inductance: 10nH
Inductor, 10nH, ±5%, 260mΩ, 600mA, SMD 0603; Manufacturer: Chilisin Elec; Manufacturer Part Number: CLH1608T-10NJ-S; Self-Resonant Frequency: 3GHz; Q Factor: 12@100MHz; Package Size: 0603; JLCPCB Basic Part: No; JLCPCB Part Number: C180938; Supplier 1: LCSC; Category: Inductors; Supplier Part Number 1: C180938; Tolerance: ±5%; Rated Current: 600mA; DC Resistance: 260mΩ; RoHS: Yes; ComponentLink1Description: Datasheet; ComponentLink1URL: https://wmsc.lcsc.com/wmsc/upload/file/pdf/v2/lcsc/1811151424_Chilisin-Elec-CLH1608T-10NJ-S_C180938.pdf; ComponentLink2Description: JLCPCB Part URL; ComponentLink2URL: https://jlcpcb.com/partdetail/C180938; ComponentLink3Description: LCSC Part URL; ComponentLink3URL: https://lcsc.com/product-detail/Inductors-SMD_Chilisin-Elec-Chilisin-Elec-CLH1608T-10NJ-S_C180938.html
footprint IND-0603 (0603 (1608M) Inductor)
pins: 1, 2

## CLH1608T-10NK-S
designator L?  Inductance: 10nH
Inductor, 10nH, ±10%, 260mΩ, 600mA, SMD 0603; Manufacturer: Chilisin Elec; Manufacturer Part Number: CLH1608T-10NK-S; Self-Resonant Frequency: 3GHz; Q Factor: 12@100MHz; Package Size: 0603; JLCPCB Basic Part: No; JLCPCB Part Number: C285975; Supplier 1: LCSC; Category: Inductors; Supplier Part Number 1: C285975; Tolerance: ±10%; Rated Current: 600mA; DC Resistance: 260mΩ; RoHS: Yes; ComponentLink1Description: Datasheet; ComponentLink1URL: https://wmsc.lcsc.com/wmsc/upload/file/pdf/v2/lcsc/2304140030_Chilisin-Elec-CLH1608T-10NK-S_C285975.pdf; ComponentLink2Description: JLCPCB Part URL; ComponentLink2URL: https://jlcpcb.com/partdetail/C285975; ComponentLink3Description: LCSC Part URL; ComponentLink3URL: https://lcsc.com/product-detail/Inductors-SMD_Chilisin-Elec-Chilisin-Elec-CLH1608T-10NK-S_C285975.html
footprint IND-0603 (0603 (1608M) Inductor)
pins: 1, 2

## CLH1608T-12NJ-S
designator L?  Inductance: 12nH
Inductor, 12nH, ±5%, 280mΩ, 600mA, SMD 0603; Manufacturer: Chilisin Elec; Manufacturer Part Number: CLH1608T-12NJ-S; Self-Resonant Frequency: 2.6GHz; Q Factor: 12@100MHz; Package Size: 0603; JLCPCB Basic Part: No; JLCPCB Part Number: C108264; Supplier 1: LCSC; Category: Inductors; Supplier Part Number 1: C108264; Tolerance: ±5%; Rated Current: 600mA; DC Resistance: 280mΩ; RoHS: Yes; ComponentLink1Description: Datasheet; ComponentLink1URL: https://wmsc.lcsc.com/wmsc/upload/file/pdf/v2/lcsc/2304140030_Chilisin-Elec-CLH1608T-12NJ-S_C108264.pdf; ComponentLink2Description: JLCPCB Part URL; ComponentLink2URL: https://jlcpcb.com/partdetail/C108264; ComponentLink3Description: LCSC Part URL; ComponentLink3URL: https://lcsc.com/product-detail/Inductors-SMD_Chilisin-Elec-Chilisin-Elec-CLH1608T-12NJ-S_C108264.html
footprint IND-0603 (0603 (1608M) Inductor)
pins: 1, 2

## CLH1608T-15NJ-S
designator L?  Inductance: 15nH
Inductor, 15nH, ±5%, 320mΩ, 600mA, SMD 0603; Manufacturer: Chilisin Elec; Manufacturer Part Number: CLH1608T-15NJ-S; Self-Resonant Frequency: 2.5GHz; Q Factor: 12@100MHz; Package Size: 0603; JLCPCB Basic Part: No; JLCPCB Part Number: C142207; Supplier 1: LCSC; Category: Inductors; Supplier Part Number 1: C142207; Tolerance: ±5%; Rated Current: 600mA; DC Resistance: 320mΩ; RoHS: Yes; ComponentLink1Description: Datasheet; ComponentLink1URL: https://wmsc.lcsc.com/wmsc/upload/file/pdf/v2/lcsc/2304140030_Chilisin-Elec-CLH1608T-15NJ-S_C142207.pdf; ComponentLink2Description: JLCPCB Part URL; ComponentLink2URL: https://jlcpcb.com/partdetail/C142207; ComponentLink3Description: LCSC Part URL; ComponentLink3URL: https://lcsc.com/product-detail/Inductors-SMD_Chilisin-Elec-Chilisin-Elec-CLH1608T-15NJ-S_C142207.html
footprint IND-0603 (0603 (1608M) Inductor)
pins: 1, 2

## CLH1608T-18NJ-S
designator L?  Inductance: 18nH
Inductor, 18nH, ±5%, 350mΩ, 600mA, SMD 0603; Manufacturer: Chilisin Elec; Manufacturer Part Number: CLH1608T-18NJ-S; Self-Resonant Frequency: 2.4GHz; Q Factor: 12@100MHz; Package Size: 0603; JLCPCB Basic Part: No; JLCPCB Part Number: C180937; Supplier 1: LCSC; Category: Inductors; Supplier Part Number 1: C180937; Tolerance: ±5%; Rated Current: 600mA; DC Resistance: 350mΩ; RoHS: Yes; ComponentLink1Description: Datasheet; ComponentLink1URL: https://wmsc.lcsc.com/wmsc/upload/file/pdf/v2/lcsc/2304140030_Chilisin-Elec-CLH1608T-18NJ-S_C180937.pdf; ComponentLink2Description: JLCPCB Part URL; ComponentLink2URL: https://jlcpcb.com/partdetail/C180937; ComponentLink3Description: LCSC Part URL; ComponentLink3URL: https://lcsc.com/product-detail/Inductors-SMD_Chilisin-Elec-Chilisin-Elec-CLH1608T-18NJ-S_C180937.html
footprint IND-0603 (0603 (1608M) Inductor)
pins: 1, 2

## CLH1608T-22NJ-S
designator L?  Inductance: 22nH
Inductor, 22nH, ±5%, 400mΩ, 500mA, SMD 0603; Manufacturer: Chilisin Elec; Manufacturer Part Number: CLH1608T-22NJ-S; Self-Resonant Frequency: 2GHz; Q Factor: 12@100MHz; Package Size: 0603; JLCPCB Basic Part: No; JLCPCB Part Number: C142205; Supplier 1: LCSC; Category: Inductors; Supplier Part Number 1: C142205; Tolerance: ±5%; Rated Current: 500mA; DC Resistance: 400mΩ; RoHS: Yes; ComponentLink1Description: Datasheet; ComponentLink1URL: https://wmsc.lcsc.com/wmsc/upload/file/pdf/v2/lcsc/2304140030_Chilisin-Elec-CLH1608T-22NJ-S_C142205.pdf; ComponentLink2Description: JLCPCB Part URL; ComponentLink2URL: https://jlcpcb.com/partdetail/C142205; ComponentLink3Description: LCSC Part URL; ComponentLink3URL: https://lcsc.com/product-detail/Inductors-SMD_Chilisin-Elec-Chilisin-Elec-CLH1608T-22NJ-S_C142205.html
footprint IND-0603 (0603 (1608M) Inductor)
pins: 1, 2

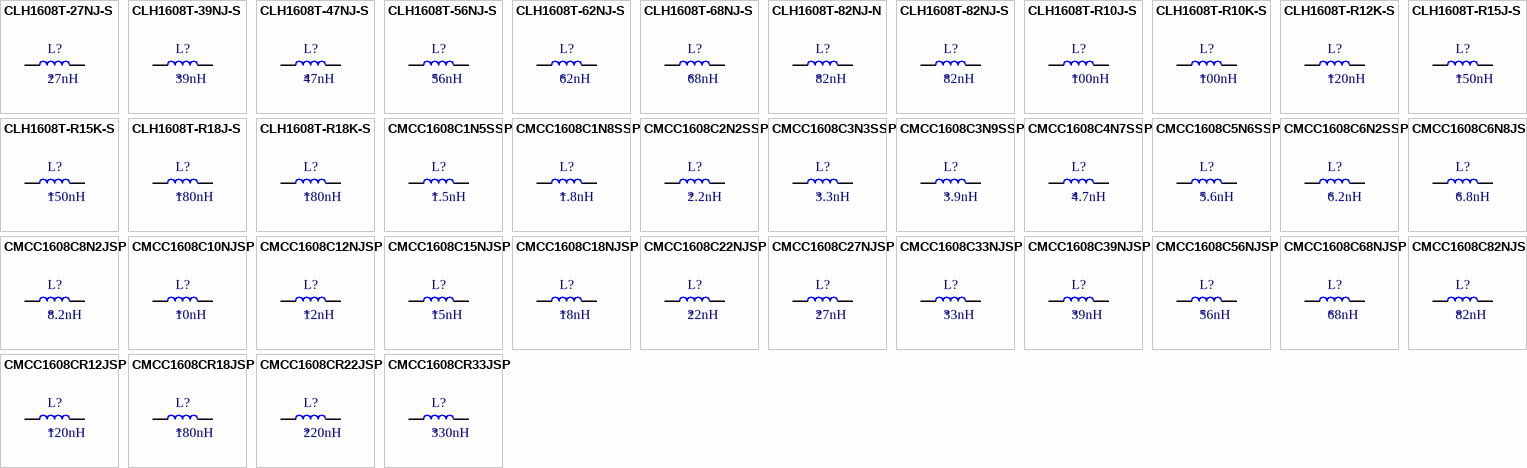
[diagram p2: symbols CLH1608T-27NJ-S to CMCC1608CR33JSP]

## CLH1608T-27NJ-S
designator L?  Inductance: 27nH
Inductor, 27nH, ±5%, 450mΩ, 500mA, SMD 0603; Manufacturer: Chilisin Elec; Manufacturer Part Number: CLH1608T-27NJ-S; Self-Resonant Frequency: 1.9GHz; Q Factor: 12@100MHz; Package Size: 0603; JLCPCB Basic Part: No; JLCPCB Part Number: C142204; Supplier 1: LCSC; Category: Inductors; Supplier Part Number 1: C142204; Tolerance: ±5%; Rated Current: 500mA; DC Resistance: 450mΩ; RoHS: Yes; ComponentLink1Description: Datasheet; ComponentLink1URL: https://wmsc.lcsc.com/wmsc/upload/file/pdf/v2/lcsc/1810261322_Chilisin-Elec-CLH1608T-27NJ-S_C142204.pdf; ComponentLink2Description: JLCPCB Part URL; ComponentLink2URL: https://jlcpcb.com/partdetail/C142204; ComponentLink3Description: LCSC Part URL; ComponentLink3URL: https://lcsc.com/product-detail/Inductors-SMD_Chilisin-Elec-Chilisin-Elec-CLH1608T-27NJ-S_C142204.html
footprint IND-0603 (0603 (1608M) Inductor)
pins: 1, 2

## CLH1608T-39NJ-S
designator L?  Inductance: 39nH
Inductor, 39nH, ±5%, 600mΩ, 400mA, SMD 0603; Manufacturer: Chilisin Elec; Manufacturer Part Number: CLH1608T-39NJ-S; Self-Resonant Frequency: 1.4GHz; Q Factor: 12@100MHz; Package Size: 0603; JLCPCB Basic Part: No; JLCPCB Part Number: C142200; Supplier 1: LCSC; Category: Inductors; Supplier Part Number 1: C142200; Tolerance: ±5%; Rated Current: 400mA; DC Resistance: 600mΩ; RoHS: Yes; ComponentLink1Description: Datasheet; ComponentLink1URL: https://wmsc.lcsc.com/wmsc/upload/file/pdf/v2/lcsc/2304140030_Chilisin-Elec-CLH1608T-39NJ-S_C142200.pdf; ComponentLink2Description: JLCPCB Part URL; ComponentLink2URL: https://jlcpcb.com/partdetail/C142200; ComponentLink3Description: LCSC Part URL; ComponentLink3URL: https://lcsc.com/product-detail/Inductors-SMD_Chilisin-Elec-Chilisin-Elec-CLH1608T-39NJ-S_C142200.html
footprint IND-0603 (0603 (1608M) Inductor)
pins: 1, 2

## CLH1608T-47NJ-S
designator L?  Inductance: 47nH
Inductor, 47nH, ±5%, 700mΩ, 400mA, SMD 0603; Manufacturer: Chilisin Elec; Manufacturer Part Number: CLH1608T-47NJ-S; Self-Resonant Frequency: 1.3GHz; Q Factor: 12@100MHz; Package Size: 0603; JLCPCB Basic Part: No; JLCPCB Part Number: C142198; Supplier 1: LCSC; Category: Inductors; Supplier Part Number 1: C142198; Tolerance: ±5%; Rated Current: 400mA; DC Resistance: 700mΩ; RoHS: Yes; ComponentLink1Description: Datasheet; ComponentLink1URL: https://wmsc.lcsc.com/wmsc/upload/file/pdf/v2/lcsc/2304140030_Chilisin-Elec-CLH1608T-47NJ-S_C142198.pdf; ComponentLink2Description: JLCPCB Part URL; ComponentLink2URL: https://jlcpcb.com/partdetail/C142198; ComponentLink3Description: LCSC Part URL; ComponentLink3URL: https://lcsc.com/product-detail/Inductors-SMD_Chilisin-Elec-Chilisin-Elec-CLH1608T-47NJ-S_C142198.html
footprint IND-0603 (0603 (1608M) Inductor)
pins: 1, 2

## CLH1608T-56NJ-S
designator L?  Inductance: 56nH
Inductor, 56nH, ±5%, 750mΩ, 400mA, SMD 0603; Manufacturer: Chilisin Elec; Manufacturer Part Number: CLH1608T-56NJ-S; Self-Resonant Frequency: 1.1GHz; Q Factor: 12@100MHz; Package Size: 0603; JLCPCB Basic Part: No; JLCPCB Part Number: C295683; Supplier 1: LCSC; Category: Inductors; Supplier Part Number 1: C295683; Tolerance: ±5%; Rated Current: 400mA; DC Resistance: 750mΩ; RoHS: Yes; ComponentLink1Description: Datasheet; ComponentLink1URL: https://wmsc.lcsc.com/wmsc/upload/file/pdf/v2/lcsc/1810261340_Chilisin-Elec-CLH1608T-56NJ-S_C295683.pdf; ComponentLink2Description: JLCPCB Part URL; ComponentLink2URL: https://jlcpcb.com/partdetail/C295683; ComponentLink3Description: LCSC Part URL; ComponentLink3URL: https://lcsc.com/product-detail/Inductors-SMD_Chilisin-Elec-Chilisin-Elec-CLH1608T-56NJ-S_C295683.html
footprint IND-0603 (0603 (1608M) Inductor)
pins: 1, 2

## CLH1608T-62NJ-S
designator L?  Inductance: 62nH
Inductor, 62nH, ±5%, 850mΩ, 400mA, SMD 0603; Manufacturer: Chilisin Elec; Manufacturer Part Number: CLH1608T-62NJ-S; Self-Resonant Frequency: 1.05GHz; Q Factor: 12@100MHz; Package Size: 0603; JLCPCB Basic Part: No; JLCPCB Part Number: C373749; Supplier 1: LCSC; Category: Inductors; Supplier Part Number 1: C373749; Tolerance: ±5%; Rated Current: 400mA; DC Resistance: 850mΩ; RoHS: Yes; ComponentLink1Description: Datasheet; ComponentLink1URL: https://wmsc.lcsc.com/wmsc/upload/file/pdf/v2/lcsc/2304140030_Chilisin-Elec-CLH1608T-62NJ-S_C373749.pdf; ComponentLink2Description: JLCPCB Part URL; ComponentLink2URL: https://jlcpcb.com/partdetail/C373749; ComponentLink3Description: LCSC Part URL; ComponentLink3URL: https://lcsc.com/product-detail/Inductors-SMD_Chilisin-Elec-Chilisin-Elec-CLH1608T-62NJ-S_C373749.html
footprint IND-0603 (0603 (1608M) Inductor)
pins: 1, 2

## CLH1608T-68NJ-S
designator L?  Inductance: 68nH
Inductor, 68nH, ±5%, 850mΩ, 400mA, SMD 0603; Manufacturer: Chilisin Elec; Manufacturer Part Number: CLH1608T-68NJ-S; Self-Resonant Frequency: 1.05GHz; Q Factor: 12@100MHz; Package Size: 0603; JLCPCB Basic Part: No; JLCPCB Part Number: C142197; Supplier 1: LCSC; Category: Inductors; Supplier Part Number 1: C142197; Tolerance: ±5%; Rated Current: 400mA; DC Resistance: 850mΩ; RoHS: Yes; ComponentLink1Description: Datasheet; ComponentLink1URL: https://wmsc.lcsc.com/wmsc/upload/file/pdf/v2/lcsc/2304140030_Chilisin-Elec-CLH1608T-68NJ-S_C142197.pdf; ComponentLink2Description: JLCPCB Part URL; ComponentLink2URL: https://jlcpcb.com/partdetail/C142197; ComponentLink3Description: LCSC Part URL; ComponentLink3URL: https://lcsc.com/product-detail/Inductors-SMD_Chilisin-Elec-Chilisin-Elec-CLH1608T-68NJ-S_C142197.html
footprint IND-0603 (0603 (1608M) Inductor)
pins: 1, 2

## CLH1608T-82NJ-N
designator L?  Inductance: 82nH
Inductor, 82nH, ±5%, 1Ω, 300mA, SMD 0603; Manufacturer: Chilisin Elec; Manufacturer Part Number: CLH1608T-82NJ-N; Package Size: 0603; JLCPCB Basic Part: No; JLCPCB Part Number: C285974; Supplier 1: LCSC; Category: Inductors; Supplier Part Number 1: C285974; Tolerance: ±5%; Rated Current: 300mA; DC Resistance: 1Ω; RoHS: Yes; ComponentLink1Description: Datasheet; ComponentLink1URL: https://wmsc.lcsc.com/wmsc/upload/file/pdf/v2/lcsc/2304140030_Chilisin-Elec-CLH1608T-82NJ-N_C285974.pdf; ComponentLink2Description: JLCPCB Part URL; ComponentLink2URL: https://jlcpcb.com/partdetail/C285974; ComponentLink3Description: LCSC Part URL; ComponentLink3URL: https://lcsc.com/product-detail/Inductors-SMD_Chilisin-Elec-Chilisin-Elec-CLH1608T-82NJ-N_C285974.html
footprint IND-0603 (0603 (1608M) Inductor)
pins: 1, 2

## CLH1608T-82NJ-S
designator L?  Inductance: 82nH
Inductor, 82nH, ±5%, 1Ω, 300mA, SMD 0603; Manufacturer: Chilisin Elec; Manufacturer Part Number: CLH1608T-82NJ-S; Self-Resonant Frequency: 900MHz; Q Factor: 12@100MHz; Package Size: 0603; JLCPCB Basic Part: No; JLCPCB Part Number: C180933; Supplier 1: LCSC; Category: Inductors; Supplier Part Number 1: C180933; Tolerance: ±5%; Rated Current: 300mA; DC Resistance: 1Ω; RoHS: Yes; ComponentLink1Description: Datasheet; ComponentLink1URL: https://wmsc.lcsc.com/wmsc/upload/file/pdf/v2/lcsc/1810261212_Chilisin-Elec-CLH1608T-82NJ-S_C180933.pdf; ComponentLink2Description: JLCPCB Part URL; ComponentLink2URL: https://jlcpcb.com/partdetail/C180933; ComponentLink3Description: LCSC Part URL; ComponentLink3URL: https://lcsc.com/product-detail/Inductors-SMD_Chilisin-Elec-Chilisin-Elec-CLH1608T-82NJ-S_C180933.html
footprint IND-0603 (0603 (1608M) Inductor)
pins: 1, 2

## CLH1608T-R10J-S
designator L?  Inductance: 100nH
Inductor, 100nH, ±5%, 1.2Ω, 300mA, SMD 0603; Manufacturer: Chilisin Elec; Manufacturer Part Number: CLH1608T-R10J-S; Self-Resonant Frequency: 770MHz; Q Factor: 12@100MHz; Package Size: 0603; JLCPCB Basic Part: No; JLCPCB Part Number: C142195; Supplier 1: LCSC; Category: Inductors; Supplier Part Number 1: C142195; Tolerance: ±5%; Rated Current: 300mA; DC Resistance: 1.2Ω; RoHS: Yes; ComponentLink1Description: Datasheet; ComponentLink1URL: https://wmsc.lcsc.com/wmsc/upload/file/pdf/v2/lcsc/2304140030_Chilisin-Elec-CLH1608T-R10J-S_C142195.pdf; ComponentLink2Description: JLCPCB Part URL; ComponentLink2URL: https://jlcpcb.com/partdetail/C142195; ComponentLink3Description: LCSC Part URL; ComponentLink3URL: https://lcsc.com/product-detail/Inductors-SMD_Chilisin-Elec-Chilisin-Elec-CLH1608T-R10J-S_C142195.html
footprint IND-0603 (0603 (1608M) Inductor)
pins: 1, 2

## CLH1608T-R10K-S
designator L?  Inductance: 100nH
Inductor, 100nH, ±10%, 1.2Ω, 300mA, SMD 0603; Manufacturer: Chilisin Elec; Manufacturer Part Number: CLH1608T-R10K-S; Self-Resonant Frequency: 770MHz; Q Factor: 12@100MHz; Package Size: 0603; JLCPCB Basic Part: No; JLCPCB Part Number: C285973; Supplier 1: LCSC; Category: Inductors; Supplier Part Number 1: C285973; Tolerance: ±10%; Rated Current: 300mA; DC Resistance: 1.2Ω; RoHS: Yes; ComponentLink1Description: Datasheet; ComponentLink1URL: https://wmsc.lcsc.com/wmsc/upload/file/pdf/v2/lcsc/2304140030_Chilisin-Elec-CLH1608T-R10K-S_C285973.pdf; ComponentLink2Description: JLCPCB Part URL; ComponentLink2URL: https://jlcpcb.com/partdetail/C285973; ComponentLink3Description: LCSC Part URL; ComponentLink3URL: https://lcsc.com/product-detail/Inductors-SMD_Chilisin-Elec-Chilisin-Elec-CLH1608T-R10K-S_C285973.html
footprint IND-0603 (0603 (1608M) Inductor)
pins: 1, 2
